# Altium footprint library bldc.PcbLib: 77 footprints (part 5 of 5)
Each footprint in its own frame and in the unit in brackets; x right, y up, seen from the top. Pads: shape width x height; smd on the part's side, far side on the other; paste and mask are expansions set on the pad; w line width, h text height; cw(c..) or ccw(c..) is an arc to the next point about the centre after c.
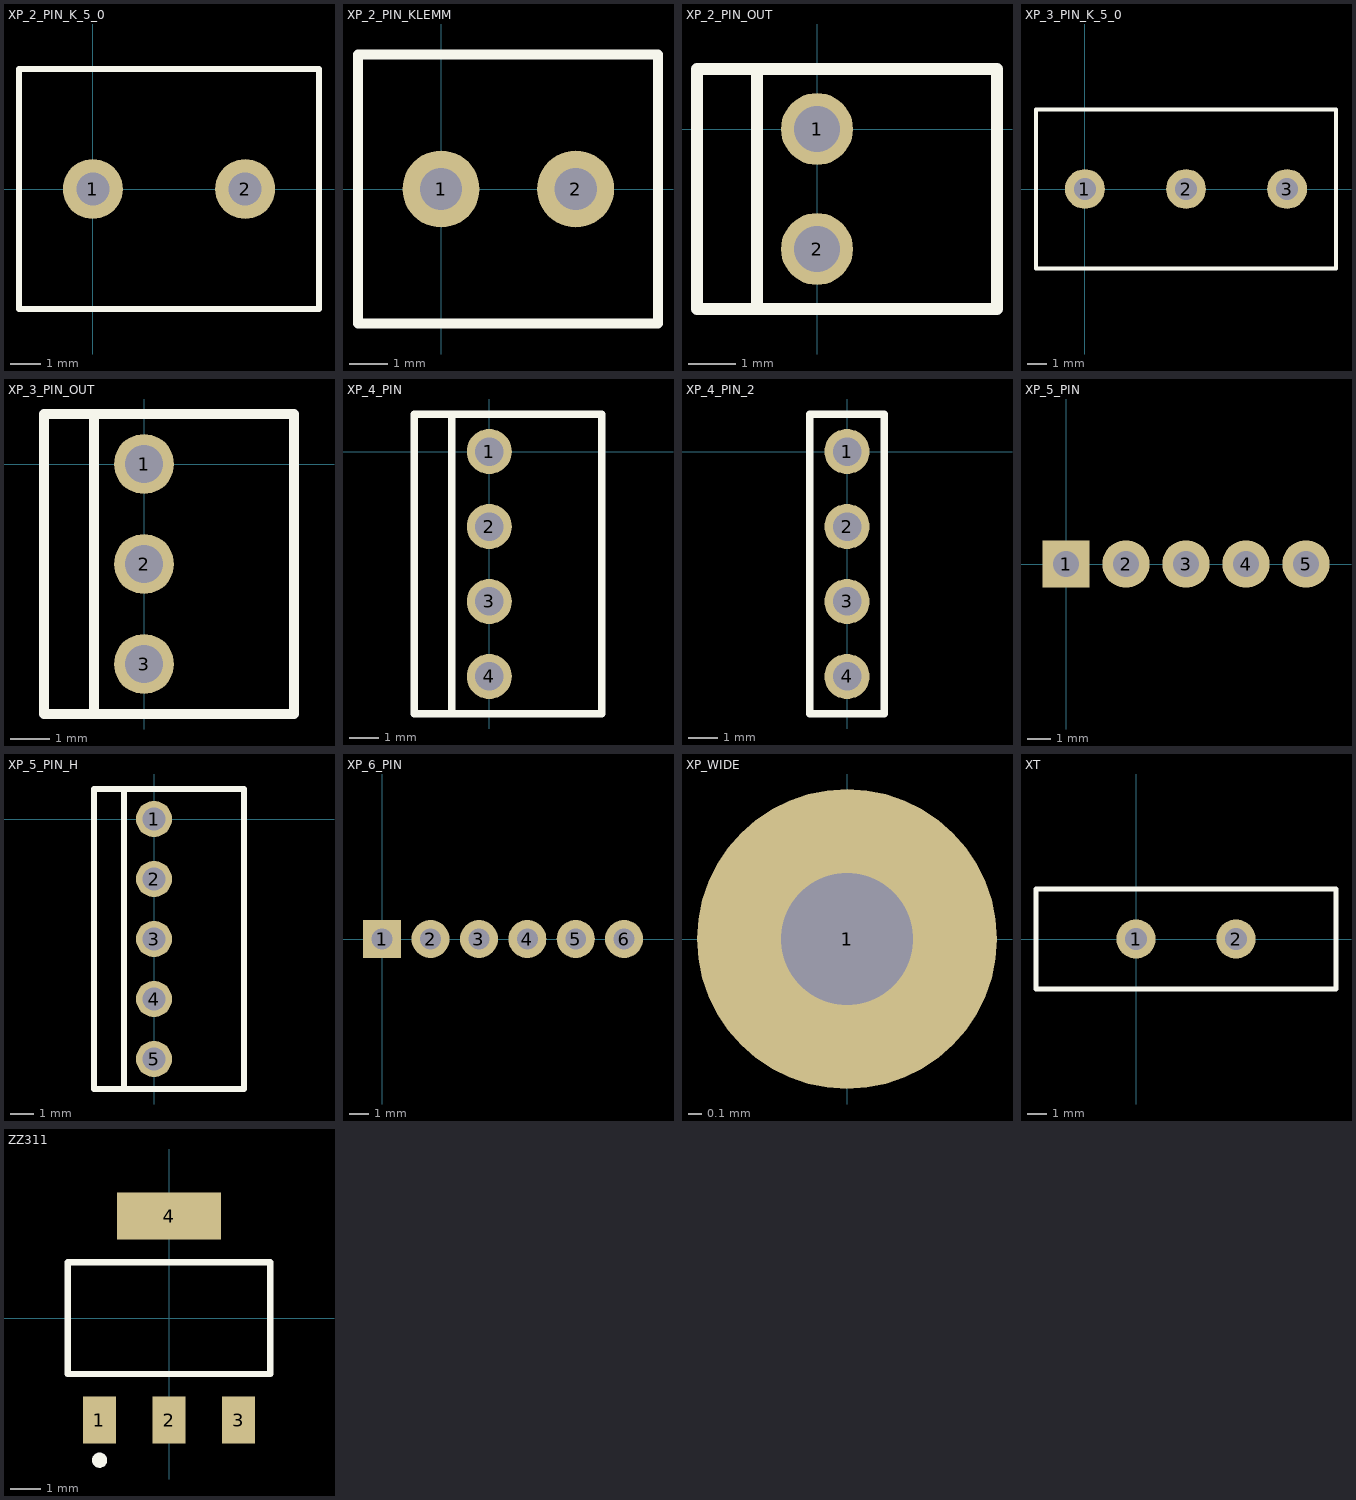
[diagram p4: the footprints below, top view; thin cyan lines are the x and y axes]

## XP_2_PIN_K_5_0 [mm]
pads (2):
  round 2 hole 1.1: 1(0,0) 2(5.08,0)
Top Overlay:
  lines w0.2: -2.46,-4 -2.46,4 7.54,4 7.54,-4 -2.46,-4

## XP_2_PIN_KLEMM [mm]
pads (2):
  round 2 hole 1.1: 1(0,0) 2(3.5,0)
Top Overlay:
  lines w0.254: -2.16,-3.5 -2.16,3.5 5.64,3.5 5.64,-3.5 -2.16,-3.5

## XP_2_PIN_OUT [mil]
pads (2):
  round 60 hole 38: 1(0,0) 2(0,-100)
Top Overlay:
  lines w10: -50,-150 -50,50 ; -100,-150 150,-150 150,50 -100,50 -100,-150

## XP_3_PIN_K_5_0 [mm]
pads (3):
  round 2 hole 1.1: 1(0,0) 2(5.08,0) 3(10.16,0)
Top Overlay:
  lines w0.2: 12.54,-4 -2.46,-4 -2.46,4 12.54,4 ; 12.62,-4 12.62,4

## XP_3_PIN_OUT [mil]
pads (3):
  round 60 hole 38: 1(0,0) 2(0,-100) 3(0,-200)
Top Overlay:
  lines w10: -50,-250 -50,50 ; -100,-250 -100,50 150,50 150,-250 -100,-250

## XP_4_PIN [mil]
pads (4):
  round 60 hole 38: 1(0,0) 2(0,-100) 3(0,-200) 4(0,-300)
Top Overlay:
  lines w10: -50,-350 -50,50 ; -100,-350 150,-350 150,50 -100,50 -100,-350

## XP_4_PIN_2 [mil]
pads (4):
  round 60 hole 38: 1(0,0) 2(0,-100) 3(0,-200) 4(0,-300)
Top Overlay:
  lines w10: -50,-350 -50,50 50,50 50,-350 -50,-350

## XP_5_PIN [mm]
pads (5):
  rect 2x2 hole 1.1: 1(0,0)
  round 2 hole 1.1: 2(2.54,0) 3(5.08,0) 4(7.62,0) 5(10.16,0)
Bottom Overlay:
  lines w0.254: -1.27,-1.27 -1.27,1.27 11.43,1.27 11.43,-1.27 -1.27,-1.27

## XP_5_PIN_H [mil]
pads (5):
  round 60 hole 38: 1(0,0) 2(0,-100) 3(0,-200) 4(0,-300) 5(0,-400)
Top Overlay:
  lines w10: -50,-450 -50,50 ; -100,-450 -100,50 150,50 150,-450 -100,-450

## XP_6_PIN [mm]
pads (6):
  rect 2x2 hole 1.1: 1(0,0)
  round 2 hole 1.1: 2(2.54,0) 3(5.08,0) 4(7.62,0) 5(10.16,0) 6(12.7,0)
Bottom Overlay:
  lines w0.254: -1.27,-1.27 14.478,-1.27 14.478,1.27 -1.27,1.27 -1.27,-1.27

## XP_WIDE [mm]
pads (1):
  round 2.2 hole 0.965: 1(0,0)

## XT [mm]
pads (2):
  round 2 hole 1.1: 1(0,0) 2(5.08,0)
Top Overlay:
  lines w0.254: -5.08,-2.54 10.16,-2.54 10.16,2.54 -5.08,2.54 -5.08,-2.54

## ZZ311 [mm] "SOT-223/SC-73; 4 Leads; Body 6.7 x 7.3 mm, inc. leads (LxW max)"
height 1.8
pads (4):
  rect 1.1x1.55 smd: 1(-2.3,-3.375) 2(0,-3.375) 3(2.3,-3.375)
  rect 3.45x1.55 smd: 4(0,3.375)
Top Overlay:
  circle w0.25: c-2.3,-4.7 r0.125
  lines w0.2: -3.35,-1.85 -3.35,1.85 3.35,1.85 3.35,-1.85 -3.35,-1.85
3D body "SOT223-3.step": height 1.6, standoff 0, extent -3.198,-3.791 3.302,3.283